# Altium schematic symbol library FPGA_Xilinx_Virtex6.SchLib: 28 symbols (part 8 of 21)
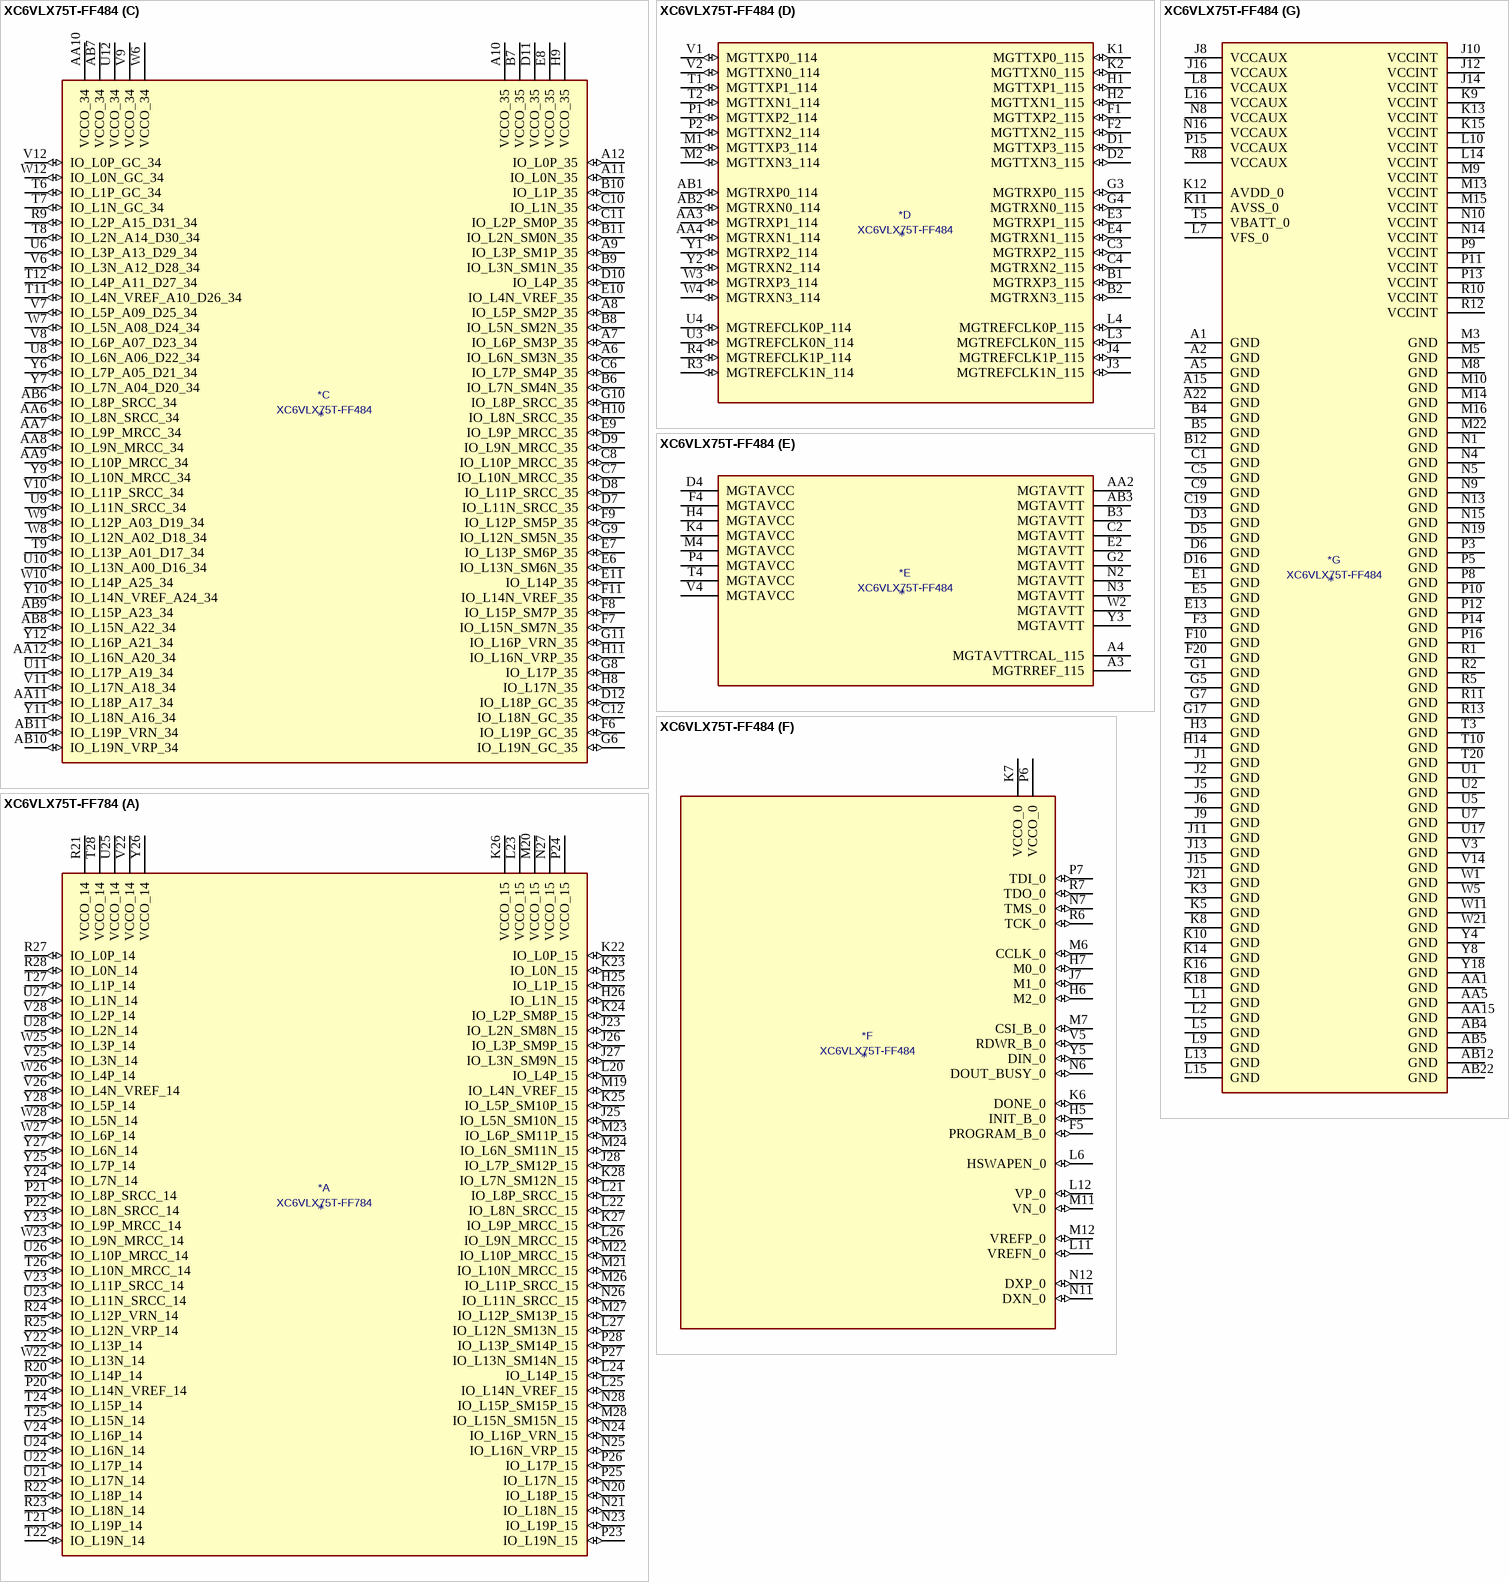
[diagram p108: symbols XC6VLX75T-FF484 to XC6VLX75T-FF784]

## XC6VLX75T-FF484
designator *  value XC6VLX75T-FF484
ki_keywords: FPGA; ki_description: Virtex 6 LXT 75 XC6VLX75T-FF484
part A pins: A20 VCCO_15 (power), A21 IO_L2P_SM8P_15 (io), AA20 VCCO_14 (power), AA21 IO_L15P_14 (io), AA22 IO_L14N_VREF_14 (io), AB20 IO_L16P_14 (io), AB21 IO_L16N_14 (io), B20 IO_L0P_15 (io), B21 IO_L2N_SM8N_15 (io), B22 IO_L5P_SM10P_15 (io), C20 IO_L0N_15 (io), C21 IO_L5N_SM10N_15 (io), C22 IO_L10P_MRCC_15 (io), D19 IO_L7N_SM12N_15 (io), D20 IO_L9P_MRCC_15 (io), D21 VCCO_15 (power), D22 IO_L10N_MRCC_15 (io), E19 IO_L7P_SM12P_15 (io), E20 IO_L9N_MRCC_15 (io), E21 IO_L11P_SRCC_15 (io), E22 IO_L11N_SRCC_15 (io), F18 IO_L1N_15 (io), F19 IO_L3N_SM9N_15 (io), F21 IO_L12P_SM13P_15 (io), F22 IO_L12N_SM13N_15 (io), G18 IO_L1P_15 (io), G19 IO_L3P_SM9P_15 (io), G20 IO_L17N_15 (io), G21 IO_L15P_SM15P_15 (io), G22 VCCO_15 (power), H17 IO_L14P_15 (io), H18 IO_L14N_VREF_15 (io), H19 VCCO_15 (power), H20 IO_L17P_15 (io), H21 IO_L15N_SM15N_15 (io), H22 IO_L18N_15 (io), J17 IO_L4N_VREF_15 (io), J18 IO_L4P_15 (io), J19 IO_L8N_SRCC_15 (io), J20 IO_L13P_SM14P_15 (io), J22 IO_L18P_15 (io), K17 IO_L6P_SM11P_15 (io), K19 IO_L8P_SRCC_15 (io), K20 IO_L13N_SM14N_15 (io), K21 IO_L19P_15 (io), K22 IO_L19N_15 (io), L17 IO_L6N_SM11N_15 (io), L18 IO_L16P_VRN_15 (io), L19 IO_L16N_VRP_15 (io), L20 VCCO_15 (power), L21 IO_L3N_14 (io), L22 IO_L3P_14 (io), M17 VCCO_14 (power), M18 IO_L0P_14 (io), M19 IO_L1N_14 (io), M20 IO_L1P_14 (io), M21 IO_L7P_14 (io), N17 IO_L6P_14 (io), N18 IO_L0N_14 (io), N20 IO_L7N_14 (io), N21 IO_L2N_14 (io), N22 IO_L2P_14 (io), P17 IO_L6N_14 (io), P18 IO_L12P_VRN_14 (io), P19 IO_L9P_MRCC_14 (io), P20 IO_L9N_MRCC_14 (io), P21 VCCO_14 (power), P22 IO_L4P_14 (io), R17 IO_L12N_VRP_14 (io), R18 VCCO_14 (power), R19 IO_L11P_SRCC_14 (io), R20 IO_L11N_SRCC_14 (io), R21 IO_L5P_14 (io), R22 IO_L4N_VREF_14 (io), T18 IO_L17P_14 (io), T19 IO_L17N_14 (io), T21 IO_L8N_SRCC_14 (io), T22 IO_L5N_14 (io), U19 IO_L13P_14 (io), U20 IO_L13N_14 (io), U21 IO_L8P_SRCC_14 (io), U22 VCCO_14 (power), V20 IO_L19P_14 (io), V21 IO_L19N_14 (io), V22 IO_L10N_MRCC_14 (io), W20 IO_L18N_14 (io), W22 IO_L10P_MRCC_14 (io), Y20 IO_L18P_14 (io), Y21 IO_L15N_14 (io), Y22 IO_L14P_14 (io)
part B pins: A13 IO_L12P_25 (io), A14 IO_L2P_25 (io), A16 IO_L5P_25 (io), A17 IO_L7P_25 (io), A18 IO_L7N_25 (io), A19 IO_L10P_MRCC_25 (io), AA13 IO_L16N_CSO_B_24 (io), AA14 IO_L18N_24 (io), AA16 IO_L11P_SRCC_24 (io), AA17 IO_L10N_MRCC_24 (io), AA18 IO_L8N_SRCC_24 (io), AA19 IO_L9P_MRCC_24 (io), AB13 IO_L16P_RS0_24 (io), AB14 IO_L18P_24 (io), AB15 IO_L19P_24 (io), AB16 IO_L19N_24 (io), AB17 VCCO_24 (power), AB18 IO_L8P_SRCC_24 (io), AB19 IO_L9N_MRCC_24 (io), B13 IO_L12N_25 (io), B14 IO_L2N_25 (io), B15 IO_L1P_25 (io), B16 IO_L5N_25 (io), B17 VCCO_25 (power), B18 IO_L13P_25 (io), B19 IO_L10N_MRCC_25 (io), C13 IO_L8P_SRCC_25 (io), C14 VCCO_25 (power), C15 IO_L1N_25 (io), C16 IO_L11P_SRCC_25 (io), C17 IO_L11N_SRCC_25 (io), C18 IO_L13N_25 (io), D13 IO_L8N_SRCC_25 (io), D14 IO_L0P_25 (io), D15 IO_L3P_25 (io), D17 IO_L17P_25 (io), D18 IO_L17N_25 (io), E12 IO_L6N_25 (io), E14 IO_L0N_25 (io), E15 IO_L3N_25 (io), E16 IO_L9P_MRCC_25 (io), E17 IO_L19P_GC_25 (io), E18 VCCO_25 (power), F12 IO_L6P_25 (io), F13 IO_L4P_25 (io), F14 IO_L14N_VREF_25 (io), F15 VCCO_25 (power), F16 IO_L9N_MRCC_25 (io), F17 IO_L19N_GC_25 (io), G12 VCCO_25 (power), G13 IO_L4N_VREF_25 (io), G14 IO_L14P_25 (io), G15 IO_L18P_GC_25 (io), G16 IO_L15P_25 (io), H12 IO_L16P_VRN_25 (io), H13 IO_L16N_VRP_25 (io), H15 IO_L18N_GC_25 (io), H16 IO_L15N_25 (io), R14 IO_L12P_D3_24 (io), R15 IO_L12N_D2_FS2_24 (io), R16 IO_L2N_D14_24 (io), T13 IO_L0P_GC_24 (io), T14 IO_L15P_FWE_B_24 (io), T15 VCCO_24 (power), T16 IO_L2P_D15_24 (io), T17 IO_L1P_GC_24 (io), U13 IO_L0N_GC_24 (io), U14 IO_L15N_RS1_24 (io), U15 IO_L13P_D1_FS1_24 (io), U16 IO_L6N_D6_24 (io), U18 IO_L1N_GC_24 (io), V13 IO_L4P_D11_24 (io), V15 IO_L13N_D0_FS0_24 (io), V16 IO_L6P_D7_24 (io), V17 IO_L3P_D13_24 (io), V18 IO_L3N_D12_24 (io), V19 VCCO_24 (power), W13 IO_L4N_VREF_D10_24 (io), W14 IO_L17N_VRP_24 (io), W15 IO_L14P_FCS_B_24 (io), W16 VCCO_24 (power), W17 IO_L5N_D8_24 (io), W18 IO_L5P_D9_24 (io), W19 IO_L7P_D5_24 (io), Y13 VCCO_24 (power), Y14 IO_L17P_VRN_24 (io), Y15 IO_L14N_VREF_FOE_B_MOSI_24 (io), Y16 IO_L11N_SRCC_24 (io), Y17 IO_L10P_MRCC_24 (io), Y19 IO_L7N_D4_24 (io)
part C pins: A6 IO_L6N_SM3N_35 (io), A7 IO_L6P_SM3P_35 (io), A8 IO_L5P_SM2P_35 (io), A9 IO_L3P_SM1P_35 (io), A10 VCCO_35 (power), A11 IO_L0N_35 (io), A12 IO_L0P_35 (io), AA6 IO_L8N_SRCC_34 (io), AA7 IO_L9P_MRCC_34 (io), AA8 IO_L9N_MRCC_34 (io), AA9 IO_L10P_MRCC_34 (io), AA10 VCCO_34 (power), AA11 IO_L18P_A17_34 (io), AA12 IO_L16N_A20_34 (io), AB6 IO_L8P_SRCC_34 (io), AB7 VCCO_34 (power), AB8 IO_L15N_A22_34 (io), AB9 IO_L15P_A23_34 (io), AB10 IO_L19N_VRP_34 (io), AB11 IO_L19P_VRN_34 (io), B6 IO_L7N_SM4N_35 (io), B7 VCCO_35 (power), B8 IO_L5N_SM2N_35 (io), B9 IO_L3N_SM1N_35 (io), B10 IO_L1P_35 (io), B11 IO_L2N_SM0N_35 (io), C6 IO_L7P_SM4P_35 (io), C7 IO_L10N_MRCC_35 (io), C8 IO_L10P_MRCC_35 (io), C10 IO_L1N_35 (io), C11 IO_L2P_SM0P_35 (io), C12 IO_L18N_GC_35 (io), D7 IO_L11N_SRCC_35 (io), D8 IO_L11P_SRCC_35 (io), D9 IO_L9N_MRCC_35 (io), D10 IO_L4P_35 (io), D11 VCCO_35 (power), D12 IO_L18P_GC_35 (io), E6 IO_L13N_SM6N_35 (io), E7 IO_L13P_SM6P_35 (io), E8 VCCO_35 (power), E9 IO_L9P_MRCC_35 (io), E10 IO_L4N_VREF_35 (io), E11 IO_L14P_35 (io), F6 IO_L19P_GC_35 (io), F7 IO_L15N_SM7N_35 (io), F8 IO_L15P_SM7P_35 (io), F9 IO_L12P_SM5P_35 (io), F11 IO_L14N_VREF_35 (io), G6 IO_L19N_GC_35 (io), G8 IO_L17P_35 (io), G9 IO_L12N_SM5N_35 (io), G10 IO_L8P_SRCC_35 (io), G11 IO_L16P_VRN_35 (io), H8 IO_L17N_35 (io), H9 VCCO_35 (power), H10 IO_L8N_SRCC_35 (io), H11 IO_L16N_VRP_35 (io), R9 IO_L2P_A15_D31_34 (io), T6 IO_L1P_GC_34 (io), T7 IO_L1N_GC_34 (io), T8 IO_L2N_A14_D30_34 (io), T9 IO_L13P_A01_D17_34 (io), T11 IO_L4N_VREF_A10_D26_34 (io), T12 IO_L4P_A11_D27_34 (io), U6 IO_L3P_A13_D29_34 (io), U8 IO_L6N_A06_D22_34 (io), U9 IO_L11N_SRCC_34 (io), U10 IO_L13N_A00_D16_34 (io), U11 IO_L17P_A19_34 (io), U12 VCCO_34 (power), V6 IO_L3N_A12_D28_34 (io), V7 IO_L5P_A09_D25_34 (io), V8 IO_L6P_A07_D23_34 (io), V9 VCCO_34 (power), V10 IO_L11P_SRCC_34 (io), V11 IO_L17N_A18_34 (io), V12 IO_L0P_GC_34 (io), W6 VCCO_34 (power), W7 IO_L5N_A08_D24_34 (io), W8 IO_L12N_A02_D18_34 (io), W9 IO_L12P_A03_D19_34 (io), W10 IO_L14P_A25_34 (io), W12 IO_L0N_GC_34 (io), Y6 IO_L7P_A05_D21_34 (io), Y7 IO_L7N_A04_D20_34 (io), Y9 IO_L10N_MRCC_34 (io), Y10 IO_L14N_VREF_A24_34 (io), Y11 IO_L18N_A16_34 (io), Y12 IO_L16P_A21_34 (io)
part D pins: AA3 MGTRXP1_114 (io), AA4 MGTRXN1_114 (io), AB1 MGTRXP0_114 (io), AB2 MGTRXN0_114 (io), B1 MGTRXP3_115 (io), B2 MGTRXN3_115 (io), C3 MGTRXP2_115 (io), C4 MGTRXN2_115 (io), D1 MGTTXP3_115 (io), D2 MGTTXN3_115 (io), E3 MGTRXP1_115 (io), E4 MGTRXN1_115 (io), F1 MGTTXP2_115 (io), F2 MGTTXN2_115 (io), G3 MGTRXP0_115 (io), G4 MGTRXN0_115 (io), H1 MGTTXP1_115 (io), H2 MGTTXN1_115 (io), J3 MGTREFCLK1N_115 (io), J4 MGTREFCLK1P_115 (io), K1 MGTTXP0_115 (io), K2 MGTTXN0_115 (io), L3 MGTREFCLK0N_115 (io), L4 MGTREFCLK0P_115 (io), M1 MGTTXP3_114 (io), M2 MGTTXN3_114 (io), P1 MGTTXP2_114 (io), P2 MGTTXN2_114 (io), R3 MGTREFCLK1N_114 (io), R4 MGTREFCLK1P_114 (io), T1 MGTTXP1_114 (io), T2 MGTTXN1_114 (io), U3 MGTREFCLK0N_114 (io), U4 MGTREFCLK0P_114 (io), V1 MGTTXP0_114 (io), V2 MGTTXN0_114 (io), W3 MGTRXP3_114 (io), W4 MGTRXN3_114 (io), Y1 MGTRXP2_114 (io), Y2 MGTRXN2_114 (io)
part E pins: A3 MGTRREF_115 (power), A4 MGTAVTTRCAL_115 (power), AA2 MGTAVTT (power), AB3 MGTAVTT (power), B3 MGTAVTT (power), C2 MGTAVTT (power), D4 MGTAVCC (power), E2 MGTAVTT (power), F4 MGTAVCC (power), G2 MGTAVTT (power), H4 MGTAVCC (power), K4 MGTAVCC (power), M4 MGTAVCC (power), N2 MGTAVTT (power), N3 MGTAVTT (power), P4 MGTAVCC (power), T4 MGTAVCC (power), V4 MGTAVCC (power), W2 MGTAVTT (power), Y3 MGTAVTT (power)
part F pins: F5 PROGRAM_B_0 (io), H5 INIT_B_0 (io), H6 M2_0 (io), H7 M0_0 (io), J7 M1_0 (io), K6 DONE_0 (io), K7 VCCO_0 (power), L6 HSWAPEN_0 (io), L11 VREFN_0 (io), L12 VP_0 (io), M6 CCLK_0 (io), M7 CSI_B_0 (io), M11 VN_0 (io), M12 VREFP_0 (io), N6 DOUT_BUSY_0 (io), N7 TMS_0 (io), N11 DXN_0 (io), N12 DXP_0 (io), P6 VCCO_0 (power), P7 TDI_0 (io), R6 TCK_0 (io), R7 TDO_0 (io), V5 RDWR_B_0 (io), Y5 DIN_0 (io)
part G pins: A1 GND (power), A2 GND (power), A5 GND (power), A15 GND (power), A22 GND (power), AA1 GND (power), AA5 GND (power), AA15 GND (power), AB4 GND (power), AB5 GND (power), AB12 GND (power), AB22 GND (power), B4 GND (power), B5 GND (power), B12 GND (power), C1 GND (power), C5 GND (power), C9 GND (power), C19 GND (power), D3 GND (power), D5 GND (power), D6 GND (power), D16 GND (power), E1 GND (power), E5 GND (power), E13 GND (power), F3 GND (power), F10 GND (power), F20 GND (power), G1 GND (power), G5 GND (power), G7 GND (power), G17 GND (power), H3 GND (power), H14 GND (power), J1 GND (power), J2 GND (power), J5 GND (power), J6 GND (power), J8 VCCAUX (power), J9 GND (power), J10 VCCINT (power), J11 GND (power), J12 VCCINT (power), J13 GND (power), J14 VCCINT (power), J15 GND (power), J16 VCCAUX (power), J21 GND (power), K3 GND (power), K5 GND (power), K8 GND (power), K9 VCCINT (power), K10 GND (power), K11 AVSS_0 (power), K12 AVDD_0 (power), K13 VCCINT (power), K14 GND (power), K15 VCCINT (power), K16 GND (power), K18 GND (power), L1 GND (power), L2 GND (power), L5 GND (power), L7 VFS_0 (power), L8 VCCAUX (power), L9 GND (power), L10 VCCINT (power), L13 GND (power), L14 VCCINT (power), L15 GND (power), L16 VCCAUX (power), M3 GND (power), M5 GND (power), M8 GND (power), M9 VCCINT (power), M10 GND (power), M13 VCCINT (power), M14 GND (power), M15 VCCINT (power), M16 GND (power), M22 GND (power), N1 GND (power), N4 GND (power), N5 GND (power), N8 VCCAUX (power), N9 GND (power), N10 VCCINT (power), N13 GND (power), N14 VCCINT (power), N15 GND (power), N16 VCCAUX (power), N19 GND (power), P3 GND (power), P5 GND (power), P8 GND (power), P9 VCCINT (power), P10 GND (power), P11 VCCINT (power), P12 GND (power), P13 VCCINT (power), P14 GND (power), P15 VCCAUX (power), P16 GND (power), R1 GND (power), R2 GND (power), R5 GND (power), R8 VCCAUX (power), R10 VCCINT (power), R11 GND (power), R12 VCCINT (power), R13 GND (power), T3 GND (power), T5 VBATT_0 (power), T10 GND (power), T20 GND (power), U1 GND (power), U2 GND (power), U5 GND (power), U7 GND (power), U17 GND (power), V3 GND (power), V14 GND (power), W1 GND (power), W5 GND (power), W11 GND (power), W21 GND (power), Y4 GND (power), Y8 GND (power), Y18 GND (power)

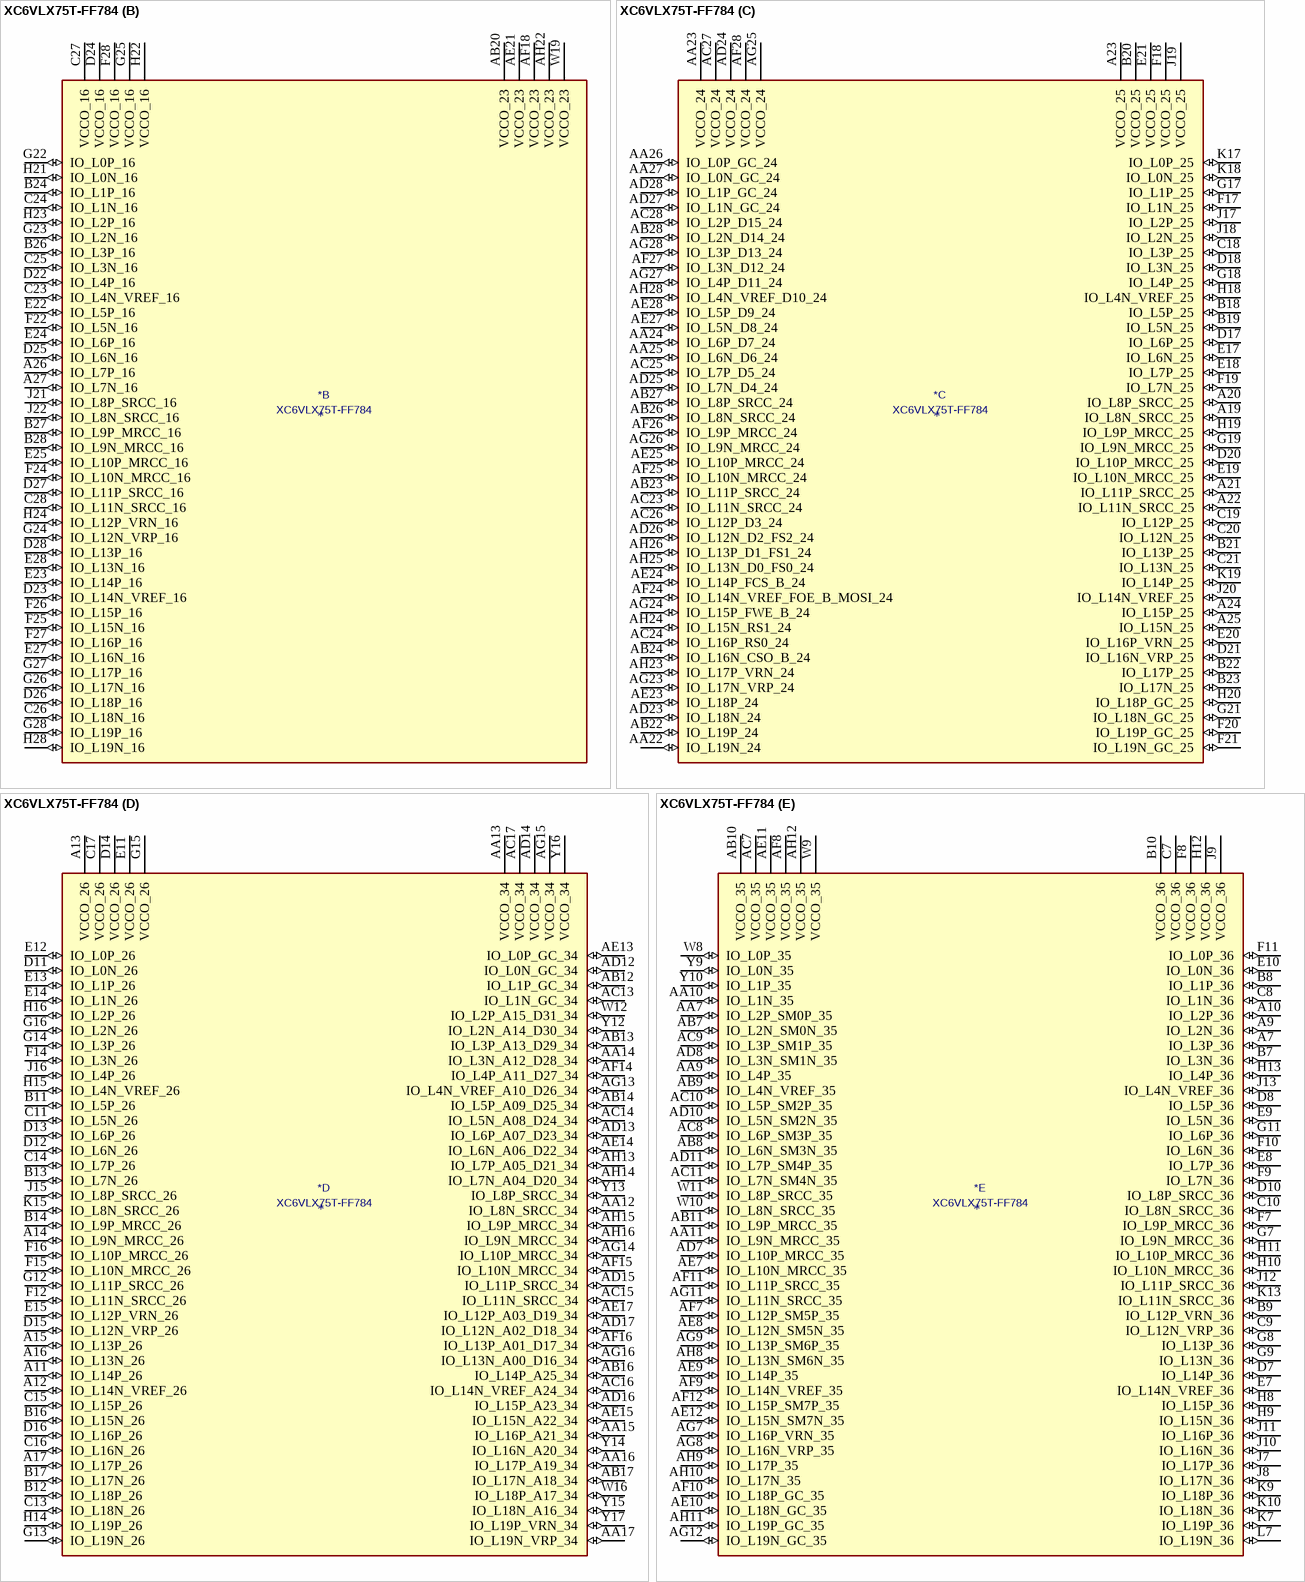
[diagram p35: symbol XC6VLX75T-FF784]

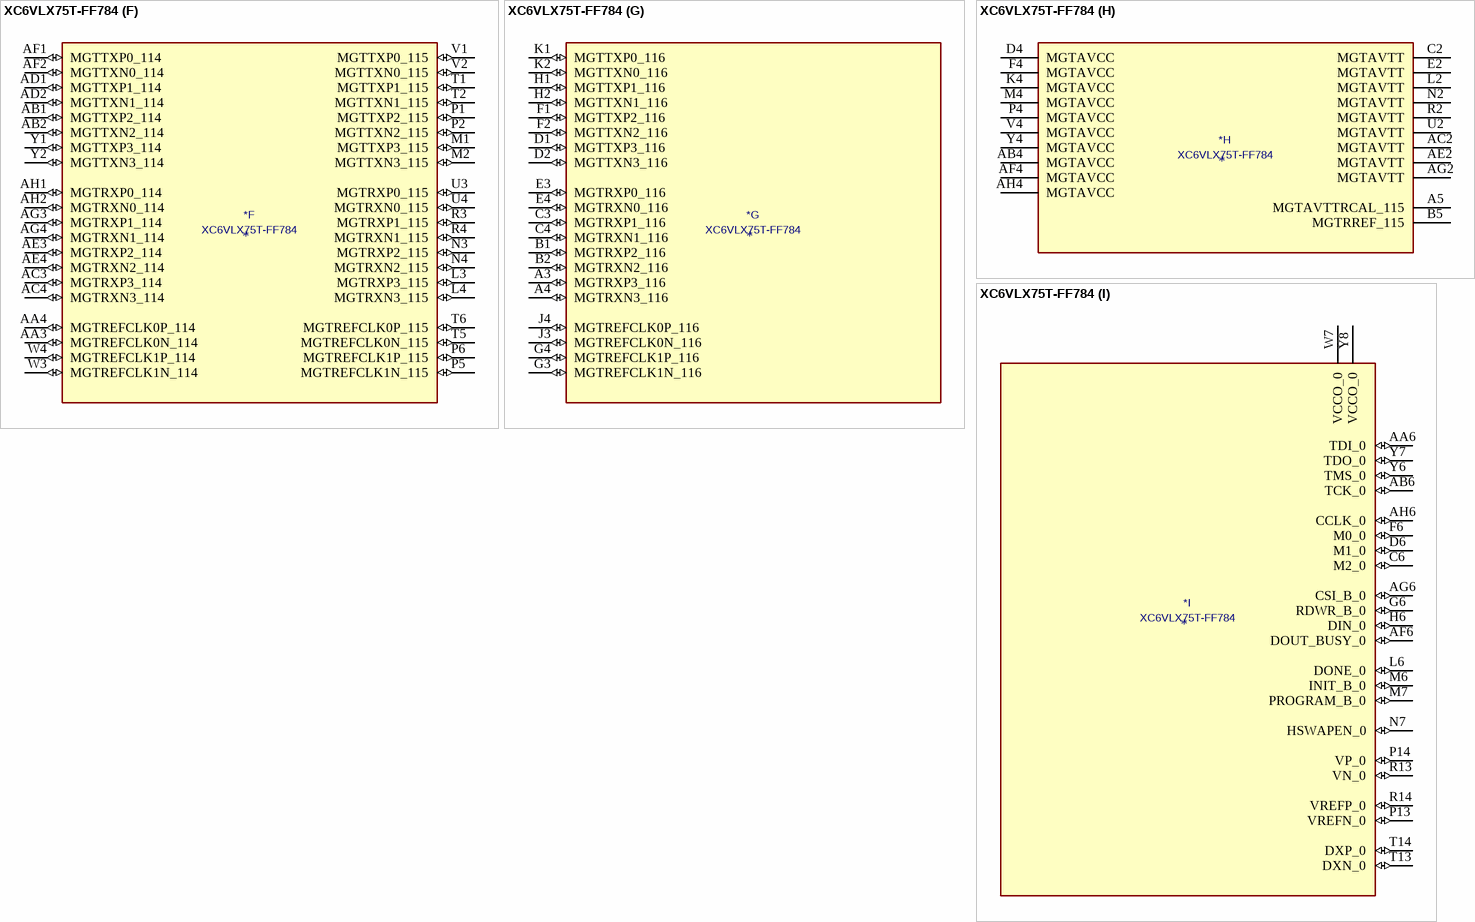
[diagram p36: symbol XC6VLX75T-FF784]

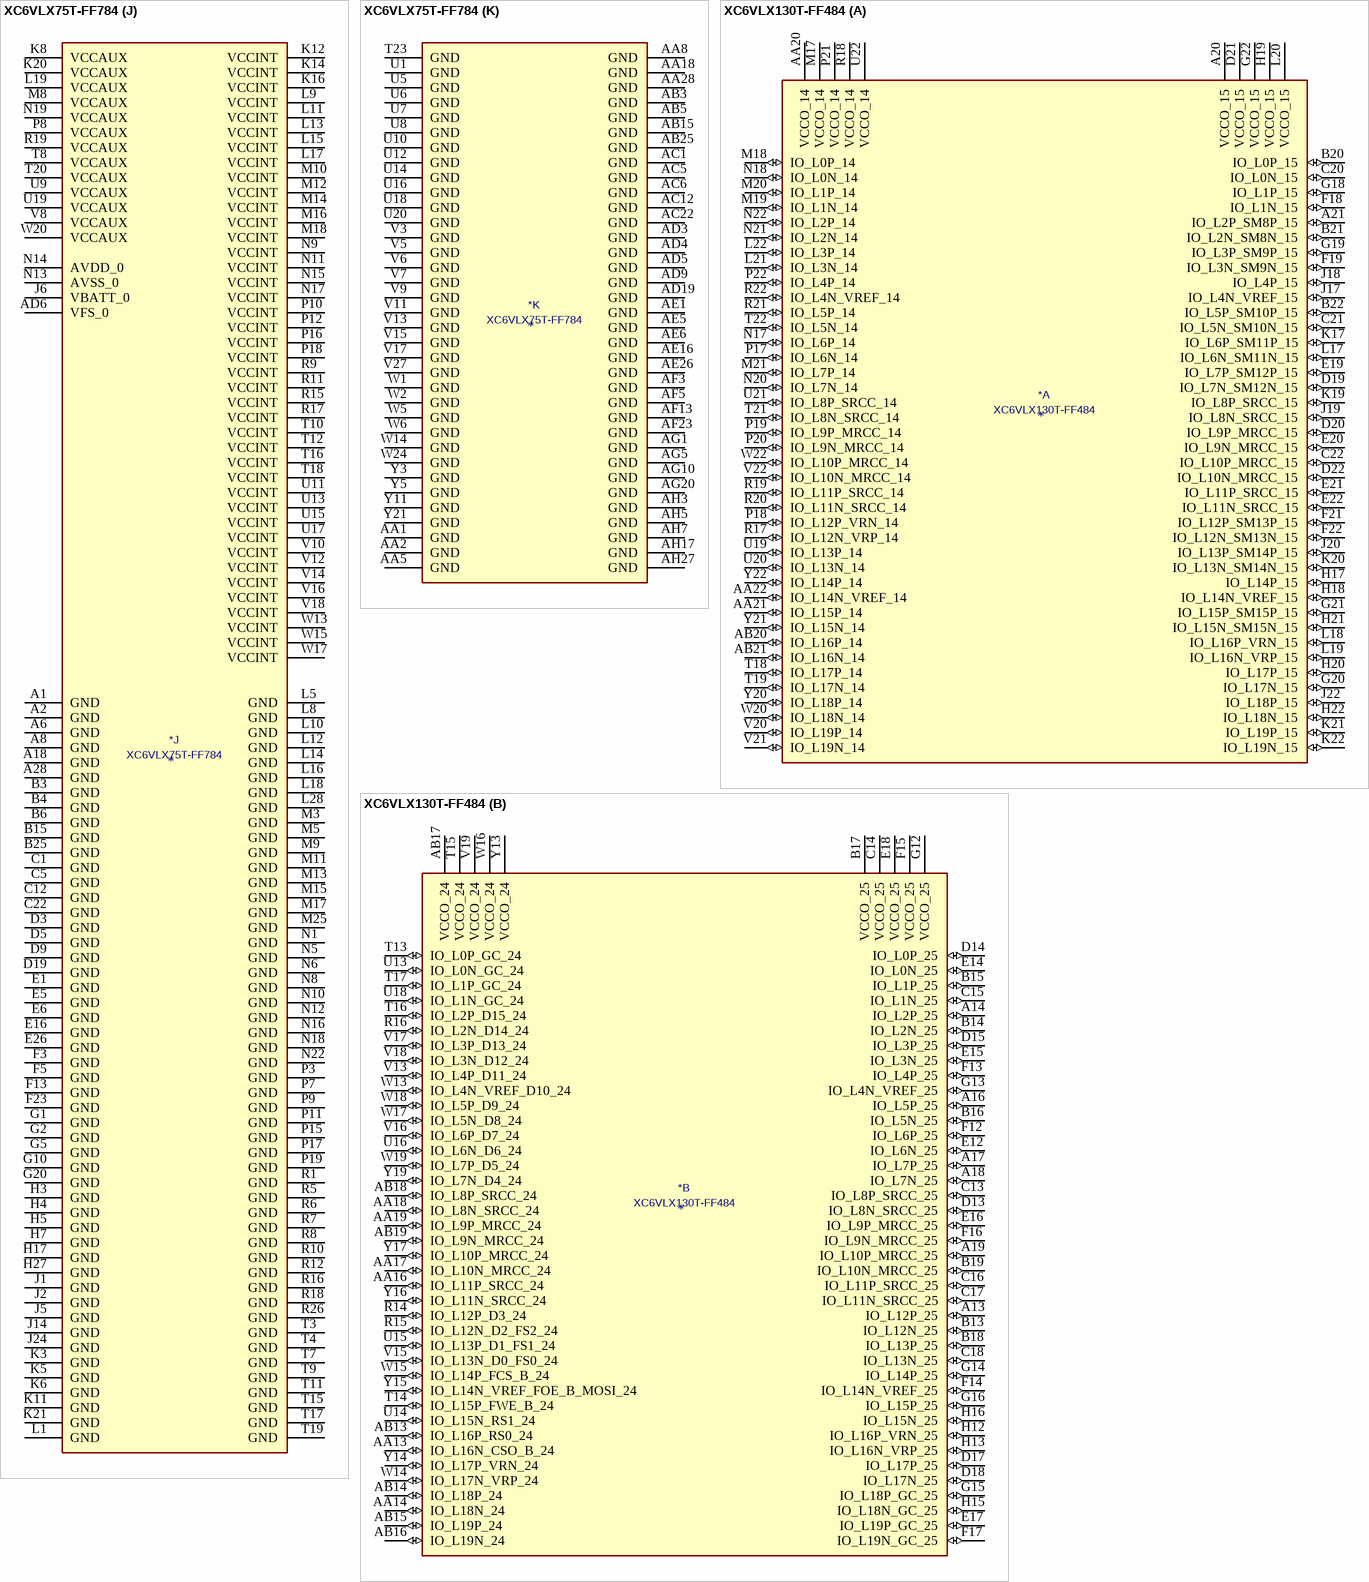
[diagram p37: symbols XC6VLX75T-FF784 to XC6VLX130T-FF484]

## XC6VLX75T-FF784
designator *  value XC6VLX75T-FF784
ki_keywords: FPGA; ki_description: Virtex 6 LXT 75 XC6VLX75T-FF784
part A pins: H25 IO_L1P_15 (io), H26 IO_L1N_15 (io), J23 IO_L2N_SM8N_15 (io), J25 IO_L5N_SM10N_15 (io), J26 IO_L3P_SM9P_15 (io), J27 IO_L3N_SM9N_15 (io), J28 IO_L7P_SM12P_15 (io), K22 IO_L0P_15 (io), K23 IO_L0N_15 (io), K24 IO_L2P_SM8P_15 (io), K25 IO_L5P_SM10P_15 (io), K26 VCCO_15 (power), K27 IO_L9P_MRCC_15 (io), K28 IO_L7N_SM12N_15 (io), L20 IO_L4P_15 (io), L21 IO_L8P_SRCC_15 (io), L22 IO_L8N_SRCC_15 (io), L23 VCCO_15 (power), L24 IO_L14P_15 (io), L25 IO_L14N_VREF_15 (io), L26 IO_L9N_MRCC_15 (io), L27 IO_L12N_SM13N_15 (io), M19 IO_L4N_VREF_15 (io), M20 VCCO_15 (power), M21 IO_L10N_MRCC_15 (io), M22 IO_L10P_MRCC_15 (io), M23 IO_L6P_SM11P_15 (io), M24 IO_L6N_SM11N_15 (io), M26 IO_L11P_SRCC_15 (io), M27 IO_L12P_SM13P_15 (io), M28 IO_L15N_SM15N_15 (io), N20 IO_L18P_15 (io), N21 IO_L18N_15 (io), N23 IO_L19P_15 (io), N24 IO_L16P_VRN_15 (io), N25 IO_L16N_VRP_15 (io), N26 IO_L11N_SRCC_15 (io), N27 VCCO_15 (power), N28 IO_L15P_SM15P_15 (io), P20 IO_L14N_VREF_14 (io), P21 IO_L8P_SRCC_14 (io), P22 IO_L8N_SRCC_14 (io), P23 IO_L19N_15 (io), P24 VCCO_15 (power), P25 IO_L17N_15 (io), P26 IO_L17P_15 (io), P27 IO_L13N_SM14N_15 (io), P28 IO_L13P_SM14P_15 (io), R20 IO_L14P_14 (io), R21 VCCO_14 (power), R22 IO_L18P_14 (io), R23 IO_L18N_14 (io), R24 IO_L12P_VRN_14 (io), R25 IO_L12N_VRP_14 (io), R27 IO_L0P_14 (io), R28 IO_L0N_14 (io), T21 IO_L19P_14 (io), T22 IO_L19N_14 (io), T24 IO_L15P_14 (io), T25 IO_L15N_14 (io), T26 IO_L10N_MRCC_14 (io), T27 IO_L1P_14 (io), T28 VCCO_14 (power), U21 IO_L17N_14 (io), U22 IO_L17P_14 (io), U23 IO_L11N_SRCC_14 (io), U24 IO_L16N_14 (io), U25 VCCO_14 (power), U26 IO_L10P_MRCC_14 (io), U27 IO_L1N_14 (io), U28 IO_L2N_14 (io), V22 VCCO_14 (power), V23 IO_L11P_SRCC_14 (io), V24 IO_L16P_14 (io), V25 IO_L3N_14 (io), V26 IO_L4N_VREF_14 (io), V28 IO_L2P_14 (io), W22 IO_L13N_14 (io), W23 IO_L9N_MRCC_14 (io), W25 IO_L3P_14 (io), W26 IO_L4P_14 (io), W27 IO_L6P_14 (io), W28 IO_L5N_14 (io), Y22 IO_L13P_14 (io), Y23 IO_L9P_MRCC_14 (io), Y24 IO_L7N_14 (io), Y25 IO_L7P_14 (io), Y26 VCCO_14 (power), Y27 IO_L6N_14 (io), Y28 IO_L5P_14 (io)
part B pins: A26 IO_L7P_16 (io), A27 IO_L7N_16 (io), AB20 VCCO_23 (power), AE21 VCCO_23 (power), AF18 VCCO_23 (power), AH22 VCCO_23 (power), B24 IO_L1P_16 (io), B26 IO_L3P_16 (io), B27 IO_L9P_MRCC_16 (io), B28 IO_L9N_MRCC_16 (io), C23 IO_L4N_VREF_16 (io), C24 IO_L1N_16 (io), C25 IO_L3N_16 (io), C26 IO_L18N_16 (io), C27 VCCO_16 (power), C28 IO_L11N_SRCC_16 (io), D22 IO_L4P_16 (io), D23 IO_L14N_VREF_16 (io), D24 VCCO_16 (power), D25 IO_L6N_16 (io), D26 IO_L18P_16 (io), D27 IO_L11P_SRCC_16 (io), D28 IO_L13P_16 (io), E22 IO_L5P_16 (io), E23 IO_L14P_16 (io), E24 IO_L6P_16 (io), E25 IO_L10P_MRCC_16 (io), E27 IO_L16N_16 (io), E28 IO_L13N_16 (io), F22 IO_L5N_16 (io), F24 IO_L10N_MRCC_16 (io), F25 IO_L15N_16 (io), F26 IO_L15P_16 (io), F27 IO_L16P_16 (io), F28 VCCO_16 (power), G22 IO_L0P_16 (io), G23 IO_L2N_16 (io), G24 IO_L12N_VRP_16 (io), G25 VCCO_16 (power), G26 IO_L17N_16 (io), G27 IO_L17P_16 (io), G28 IO_L19P_16 (io), H21 IO_L0N_16 (io), H22 VCCO_16 (power), H23 IO_L2P_16 (io), H24 IO_L12P_VRN_16 (io), H28 IO_L19N_16 (io), J21 IO_L8P_SRCC_16 (io), J22 IO_L8N_SRCC_16 (io), W19 VCCO_23 (power)
part C pins: A19 IO_L8N_SRCC_25 (io), A20 IO_L8P_SRCC_25 (io), A21 IO_L11P_SRCC_25 (io), A22 IO_L11N_SRCC_25 (io), A23 VCCO_25 (power), A24 IO_L15P_25 (io), A25 IO_L15N_25 (io), AA22 IO_L19N_24 (io), AA23 VCCO_24 (power), AA24 IO_L6P_D7_24 (io), AA25 IO_L6N_D6_24 (io), AA26 IO_L0P_GC_24 (io), AA27 IO_L0N_GC_24 (io), AB22 IO_L19P_24 (io), AB23 IO_L11P_SRCC_24 (io), AB24 IO_L16N_CSO_B_24 (io), AB26 IO_L8N_SRCC_24 (io), AB27 IO_L8P_SRCC_24 (io), AB28 IO_L2N_D14_24 (io), AC23 IO_L11N_SRCC_24 (io), AC24 IO_L16P_RS0_24 (io), AC25 IO_L7P_D5_24 (io), AC26 IO_L12P_D3_24 (io), AC27 VCCO_24 (power), AC28 IO_L2P_D15_24 (io), AD23 IO_L18N_24 (io), AD24 VCCO_24 (power), AD25 IO_L7N_D4_24 (io), AD26 IO_L12N_D2_FS2_24 (io), AD27 IO_L1N_GC_24 (io), AD28 IO_L1P_GC_24 (io), AE23 IO_L18P_24 (io), AE24 IO_L14P_FCS_B_24 (io), AE25 IO_L10P_MRCC_24 (io), AE27 IO_L5N_D8_24 (io), AE28 IO_L5P_D9_24 (io), AF24 IO_L14N_VREF_FOE_B_MOSI_24 (io), AF25 IO_L10N_MRCC_24 (io), AF26 IO_L9P_MRCC_24 (io), AF27 IO_L3N_D12_24 (io), AF28 VCCO_24 (power), AG23 IO_L17N_VRP_24 (io), AG24 IO_L15P_FWE_B_24 (io), AG25 VCCO_24 (power), AG26 IO_L9N_MRCC_24 (io), AG27 IO_L4P_D11_24 (io), AG28 IO_L3P_D13_24 (io), AH23 IO_L17P_VRN_24 (io), AH24 IO_L15N_RS1_24 (io), AH25 IO_L13N_D0_FS0_24 (io), AH26 IO_L13P_D1_FS1_24 (io), AH28 IO_L4N_VREF_D10_24 (io), B18 IO_L5P_25 (io), B19 IO_L5N_25 (io), B20 VCCO_25 (power), B21 IO_L13P_25 (io), B22 IO_L17P_25 (io), B23 IO_L17N_25 (io), C18 IO_L3P_25 (io), C19 IO_L12P_25 (io), C20 IO_L12N_25 (io), C21 IO_L13N_25 (io), D17 IO_L6P_25 (io), D18 IO_L3N_25 (io), D20 IO_L10P_MRCC_25 (io), D21 IO_L16N_VRP_25 (io), E17 IO_L6N_25 (io), E18 IO_L7P_25 (io), E19 IO_L10N_MRCC_25 (io), E20 IO_L16P_VRN_25 (io), E21 VCCO_25 (power), F17 IO_L1N_25 (io), F18 VCCO_25 (power), F19 IO_L7N_25 (io), F20 IO_L19P_GC_25 (io), F21 IO_L19N_GC_25 (io), G17 IO_L1P_25 (io), G18 IO_L4P_25 (io), G19 IO_L9N_MRCC_25 (io), G21 IO_L18N_GC_25 (io), H18 IO_L4N_VREF_25 (io), H19 IO_L9P_MRCC_25 (io), H20 IO_L18P_GC_25 (io), J17 IO_L2P_25 (io), J18 IO_L2N_25 (io), J19 VCCO_25 (power), J20 IO_L14N_VREF_25 (io), K17 IO_L0P_25 (io), K18 IO_L0N_25 (io), K19 IO_L14P_25 (io)
part D pins: A11 IO_L14P_26 (io), A12 IO_L14N_VREF_26 (io), A13 VCCO_26 (power), A14 IO_L9N_MRCC_26 (io), A15 IO_L13P_26 (io), A16 IO_L13N_26 (io), A17 IO_L17P_26 (io), AA12 IO_L8N_SRCC_34 (io), AA13 VCCO_34 (power), AA14 IO_L3N_A12_D28_34 (io), AA15 IO_L16P_A21_34 (io), AA16 IO_L17P_A19_34 (io), AA17 IO_L19N_VRP_34 (io), AB12 IO_L1P_GC_34 (io), AB13 IO_L3P_A13_D29_34 (io), AB14 IO_L5P_A09_D25_34 (io), AB16 IO_L14P_A25_34 (io), AB17 IO_L17N_A18_34 (io), AC13 IO_L1N_GC_34 (io), AC14 IO_L5N_A08_D24_34 (io), AC15 IO_L11N_SRCC_34 (io), AC16 IO_L14N_VREF_A24_34 (io), AC17 VCCO_34 (power), AD12 IO_L0N_GC_34 (io), AD13 IO_L6P_A07_D23_34 (io), AD14 VCCO_34 (power), AD15 IO_L11P_SRCC_34 (io), AD16 IO_L15P_A23_34 (io), AD17 IO_L12N_A02_D18_34 (io), AE13 IO_L0P_GC_34 (io), AE14 IO_L6N_A06_D22_34 (io), AE15 IO_L15N_A22_34 (io), AE17 IO_L12P_A03_D19_34 (io), AF14 IO_L4P_A11_D27_34 (io), AF15 IO_L10N_MRCC_34 (io), AF16 IO_L13P_A01_D17_34 (io), AG13 IO_L4N_VREF_A10_D26_34 (io), AG14 IO_L10P_MRCC_34 (io), AG15 VCCO_34 (power), AG16 IO_L13N_A00_D16_34 (io), AH13 IO_L7P_A05_D21_34 (io), AH14 IO_L7N_A04_D20_34 (io), AH15 IO_L9P_MRCC_34 (io), AH16 IO_L9N_MRCC_34 (io), B11 IO_L5P_26 (io), B12 IO_L18P_26 (io), B13 IO_L7N_26 (io), B14 IO_L9P_MRCC_26 (io), B16 IO_L15N_26 (io), B17 IO_L17N_26 (io), C11 IO_L5N_26 (io), C13 IO_L18N_26 (io), C14 IO_L7P_26 (io), C15 IO_L15P_26 (io), C16 IO_L16N_26 (io), C17 VCCO_26 (power), D11 IO_L0N_26 (io), D12 IO_L6N_26 (io), D13 IO_L6P_26 (io), D14 VCCO_26 (power), D15 IO_L12N_VRP_26 (io), D16 IO_L16P_26 (io), E11 VCCO_26 (power), E12 IO_L0P_26 (io), E13 IO_L1P_26 (io), E14 IO_L1N_26 (io), E15 IO_L12P_VRN_26 (io), F12 IO_L11N_SRCC_26 (io), F14 IO_L3N_26 (io), F15 IO_L10N_MRCC_26 (io), F16 IO_L10P_MRCC_26 (io), G12 IO_L11P_SRCC_26 (io), G13 IO_L19N_26 (io), G14 IO_L3P_26 (io), G15 VCCO_26 (power), G16 IO_L2N_26 (io), H14 IO_L19P_26 (io), H15 IO_L4N_VREF_26 (io), H16 IO_L2P_26 (io), J15 IO_L8P_SRCC_26 (io), J16 IO_L4P_26 (io), K15 IO_L8N_SRCC_26 (io), W12 IO_L2P_A15_D31_34 (io), W16 IO_L18P_A17_34 (io), Y12 IO_L2N_A14_D30_34 (io), Y13 IO_L8P_SRCC_34 (io), Y14 IO_L16N_A20_34 (io), Y15 IO_L18N_A16_34 (io), Y16 VCCO_34 (power), Y17 IO_L19P_VRN_34 (io)
part E pins: A7 IO_L3P_36 (io), A9 IO_L2N_36 (io), A10 IO_L2P_36 (io), AA7 IO_L2P_SM0P_35 (io), AA9 IO_L4P_35 (io), AA10 IO_L1N_35 (io), AA11 IO_L9N_MRCC_35 (io), AB7 IO_L2N_SM0N_35 (io), AB8 IO_L6N_SM3N_35 (io), AB9 IO_L4N_VREF_35 (io), AB10 VCCO_35 (power), AB11 IO_L9P_MRCC_35 (io), AC7 VCCO_35 (power), AC8 IO_L6P_SM3P_35 (io), AC9 IO_L3P_SM1P_35 (io), AC10 IO_L5P_SM2P_35 (io), AC11 IO_L7N_SM4N_35 (io), AD7 IO_L10P_MRCC_35 (io), AD8 IO_L3N_SM1N_35 (io), AD10 IO_L5N_SM2N_35 (io), AD11 IO_L7P_SM4P_35 (io), AE7 IO_L10N_MRCC_35 (io), AE8 IO_L12N_SM5N_35 (io), AE9 IO_L14P_35 (io), AE10 IO_L18N_GC_35 (io), AE11 VCCO_35 (power), AE12 IO_L15N_SM7N_35 (io), AF7 IO_L12P_SM5P_35 (io), AF8 VCCO_35 (power), AF9 IO_L14N_VREF_35 (io), AF10 IO_L18P_GC_35 (io), AF11 IO_L11P_SRCC_35 (io), AF12 IO_L15P_SM7P_35 (io), AG7 IO_L16P_VRN_35 (io), AG8 IO_L16N_VRP_35 (io), AG9 IO_L13P_SM6P_35 (io), AG11 IO_L11N_SRCC_35 (io), AG12 IO_L19N_GC_35 (io), AH8 IO_L13N_SM6N_35 (io), AH9 IO_L17P_35 (io), AH10 IO_L17N_35 (io), AH11 IO_L19P_GC_35 (io), AH12 VCCO_35 (power), B7 IO_L3N_36 (io), B8 IO_L1P_36 (io), B9 IO_L12P_VRN_36 (io), B10 VCCO_36 (power), C7 VCCO_36 (power), C8 IO_L1N_36 (io), C9 IO_L12N_VRP_36 (io), C10 IO_L8N_SRCC_36 (io), D7 IO_L14P_36 (io), D8 IO_L5P_36 (io), D10 IO_L8P_SRCC_36 (io), E7 IO_L14N_VREF_36 (io), E8 IO_L7P_36 (io), E9 IO_L5N_36 (io), E10 IO_L0N_36 (io), F7 IO_L9P_MRCC_36 (io), F8 VCCO_36 (power), F9 IO_L7N_36 (io), F10 IO_L6N_36 (io), F11 IO_L0P_36 (io), G7 IO_L9N_MRCC_36 (io), G8 IO_L13P_36 (io), G9 IO_L13N_36 (io), G11 IO_L6P_36 (io), H8 IO_L15P_36 (io), H9 IO_L15N_36 (io), H10 IO_L10N_MRCC_36 (io), H11 IO_L10P_MRCC_36 (io), H12 VCCO_36 (power), H13 IO_L4P_36 (io), J7 IO_L17P_36 (io), J8 IO_L17N_36 (io), J9 VCCO_36 (power), J10 IO_L16N_36 (io), J11 IO_L16P_36 (io), J12 IO_L11P_SRCC_36 (io), J13 IO_L4N_VREF_36 (io), K7 IO_L19P_36 (io), K9 IO_L18P_36 (io), K10 IO_L18N_36 (io), K13 IO_L11N_SRCC_36 (io), L7 IO_L19N_36 (io), W8 IO_L0P_35 (io), W9 VCCO_35 (power), W10 IO_L8N_SRCC_35 (io), W11 IO_L8P_SRCC_35 (io), Y9 IO_L0N_35 (io), Y10 IO_L1P_35 (io)